# Altium schematic symbol library Diode - Rectifier.SchLib: 777 symbols (part 1 of 4) (continued)
## CGRC501-G (continued)
DIODE GEN PURP 50V 5A DO214AB; Manufacturer: Comchip Technology; Type: Standard; Current Reverse Leakage @ Vr: 10uA @ 50V; Voltage Forward (Vf): 1.15V @ 5A; Part Number: CGRC501-G; PartId: 27766; Supplier 1: Digi-Key; Supplier Part Number 1: 641-1174-1-ND; ComponentLink1Description: Datasheet; ComponentLink1URL: http://www.comchiptech.com/cms/UserFiles/CGRC501-G%20Thru.%20CGRC507-G%20RevA.pdf; ComponentLink2Description: Digi-Key Listing; ComponentLink2URL: https://www.digikey.com/product-detail/en/comchip-technology/CGRC501-G/641-1174-1-ND/1559135; Junction Operating Temperature: 150C (Max); Price: 0.46; Device Package: DO-214AB, SMC; Voltage DC Reverse (Vr): 50V; Current Rectified: 5A
footprint ST DO214AB SMC
pins: 1, 2

## CGRKM4001-HF
designator D?
DIODE GEN PURP 50V 1A SOD123F; Manufacturer: Comchip Technology; Type: Standard; Current Reverse Leakage @ Vr: 5uA @ 50V; Voltage Forward (Vf): 1.1V @ 1A; Part Number: CGRKM4001-HF; PartId: 29184; Supplier 1: Digi-Key; Supplier Part Number 1: 641-1511-1-ND; ComponentLink1Description: Datasheet; ComponentLink1URL: http://www.comchiptech.com/cms/UserFiles/CGRKM4001-HF%20Thru.%20CGRKM4007-HF%20RevG.pdf; ComponentLink2Description: Digi-Key Listing; ComponentLink2URL: https://www.digikey.com/product-detail/en/comchip-technology/CGRKM4001-HF/641-1511-1-ND/4772513; Junction Operating Temperature: -55C ~ 150C; Price: 0.36; Device Package: SOD-123F; Voltage DC Reverse (Vr): 50V; Current Rectified: 1A
footprint SOD123F
pins: 1, 2

## CGRKM4004-HF
designator D?
DIODE GEN PURP 400V 1A SOD123F; Manufacturer: Comchip Technology; Type: Standard; Voltage Forward (Vf): 1.1V @ 1A; Part Number: CGRKM4004-HF; PartId: 29227; Supplier 1: Digi-Key; Supplier Part Number 1: 641-1512-1-ND; ComponentLink1Description: Datasheet; ComponentLink1URL: http://www.comchiptech.com/cms/UserFiles/CGRKM4001-HF%20Thru.%20CGRKM4007-HF%20RevG.pdf; ComponentLink2Description: Digi-Key Listing; ComponentLink2URL: https://www.digikey.com/product-detail/en/comchip-technology/CGRKM4004-HF/641-1512-1-ND/4772516; Junction Operating Temperature: -55C ~ 150C; Price: 0.4; Device Package: SOD-123F; Voltage DC Reverse (Vr): 400V; Current Rectified: 1A
footprint SOD123F
pins: 1, 2

## CGRKM4005-HF
designator D?
DIODE GEN PURP 600V 1A SOD123F; Manufacturer: Comchip Technology; Type: Standard; Current Reverse Leakage @ Vr: 5uA @ 600V; Voltage Forward (Vf): 1V @ 1A; Part Number: CGRKM4005-HF; PartId: 29226; Supplier 1: Digi-Key; Supplier Part Number 1: 641-1513-1-ND; ComponentLink1Description: Datasheet; ComponentLink1URL: http://www.comchiptech.com/cms/UserFiles/CGRKM4001-HF%20Thru.%20CGRKM4007-HF%20RevG.pdf; ComponentLink2Description: Digi-Key Listing; ComponentLink2URL: https://www.digikey.com/product-detail/en/comchip-technology/CGRKM4005-HF/641-1513-1-ND/4772519; Junction Operating Temperature: -55C ~ 150C; Price: 0.36; Device Package: SOD-123F; Voltage DC Reverse (Vr): 600V; Current Rectified: 1A
footprint SOD123F
pins: 1, 2

## CGRKM4007-HF
designator D?
DIODE GEN PURP 1KV 1A SOD123F; Manufacturer: Comchip Technology; Type: Standard; Current Reverse Leakage @ Vr: 5uA @ 1000V; Voltage DC Reverse (Vr): 1000V (1kV); Voltage Forward (Vf): 1.1V @ 1A; Part Number: CGRKM4007-HF; PartId: 29183; Supplier 1: Digi-Key; Supplier Part Number 1: 641-1514-1-ND; ComponentLink1Description: Datasheet; ComponentLink1URL: http://www.comchiptech.com/cms/UserFiles/CGRKM4001-HF%20Thru.%20CGRKM4007-HF%20RevG.pdf; ComponentLink2Description: Digi-Key Listing; ComponentLink2URL: https://www.digikey.com/product-detail/en/comchip-technology/CGRKM4007-HF/641-1514-1-ND/4772522; Junction Operating Temperature: -55C ~ 150C; Price: 0.36; Device Package: SOD-123F; Current Rectified: 1A
footprint SOD123F
pins: 1, 2

## CMHD2003 TR
designator D?
DIODE GEN PURP 250V 200MA SOD123; Manufacturer: Central Semiconductor Corp; Type: Standard; Current Reverse Leakage @ Vr: 100nA @ 200V; Reverse Recovery Time (trr): 50ns; Voltage Forward (Vf): 1V @ 100mA; Part Number: CMHD2003 TR; PartId: 29414; Supplier 1: Digi-Key; Supplier Part Number 1: CMHD2003 CT-ND; ComponentLink1Description: Datasheet; ComponentLink1URL: https://www.centralsemi.com/get_document.php?cmp=1&mergetype=pd&mergepath=pd&pdf_id=CMHD2003.PDF; ComponentLink2Description: Digi-Key Listing; ComponentLink2URL: https://www.digikey.com/product-detail/en/central-semiconductor-corp/CMHD2003-TR/CMHD2003-CT-ND/5324446; Junction Operating Temperature: -65C ~ 150C; Price: 0.52; Device Package: SOD-123; Voltage DC Reverse (Vr): 250V; Current Rectified: 200mA
footprint SOD-123
pins: 1, 2

## CMHD3595 TR
designator D?
DIODE GEN PURP 150V 150MA SOD123; Manufacturer: Central Semiconductor Corp; Type: Standard; Current Reverse Leakage @ Vr: 1nA @ 125V; Reverse Recovery Time (trr): 3us; Voltage Forward (Vf): 1V @ 200mA; Part Number: CMHD3595 TR; PartId: 29438; Supplier 1: Digi-Key; Supplier Part Number 1: CMHD3595 CT-ND; ComponentLink1Description: Datasheet; ComponentLink1URL: https://www.centralsemi.com/get_document.php?cmp=1&mergetype=pd&mergepath=pd&pdf_id=CMHD3595.PDF; ComponentLink2Description: Digi-Key Listing; ComponentLink2URL: https://www.digikey.com/product-detail/en/central-semiconductor-corp/CMHD3595-TR/CMHD3595-CT-ND/4806988; Junction Operating Temperature: -65C ~ 150C; Price: 0.72; Device Package: SOD-123; Voltage DC Reverse (Vr): 150V; Current Rectified: 150mA
footprint SOD-123
pins: 1, 2

## CMHD4150 TR
designator D?
DIODE GEN PURP 50V 250MA SOD123; Manufacturer: Central Semiconductor Corp; Type: Standard; Current Reverse Leakage @ Vr: 100nA @ 50V; Reverse Recovery Time (trr): 4ns; Voltage Forward (Vf): 1V @ 200mA; Part Number: CMHD4150 TR; PartId: 29410; Supplier 1: Digi-Key; Supplier Part Number 1: CMHD4150 CT-ND; ComponentLink1Description: Datasheet; ComponentLink1URL: https://www.centralsemi.com/get_document.php?cmp=1&mergetype=pd&mergepath=pd&pdf_id=CMHD4150.PDF; ComponentLink2Description: Digi-Key Listing; ComponentLink2URL: https://www.digikey.com/product-detail/en/central-semiconductor-corp/CMHD4150-TR/CMHD4150-CT-ND/5324447; Junction Operating Temperature: -65C ~ 150C; Price: 0.45; Device Package: SOD-123; Voltage DC Reverse (Vr): 50V; Current Rectified: 250mA
footprint SOD-123
pins: 1, 2

## CMHD4448 TR
designator D?
DIODE GEN PURP 75V 250MA SOD123; Manufacturer: Central Semiconductor Corp; Type: Standard; Current Reverse Leakage @ Vr: 25nA @ 20V; Reverse Recovery Time (trr): 4ns; Voltage Forward (Vf): 1V @ 100mA; Part Number: CMHD4448 TR; PartId: 29433; Supplier 1: Digi-Key; Supplier Part Number 1: CMHD4448 CT-ND; ComponentLink1Description: Datasheet; ComponentLink1URL: https://www.centralsemi.com/get_document.php?cmp=1&mergetype=pd&mergepath=pd&pdf_id=CMHD4448.PDF; ComponentLink2Description: Digi-Key Listing; ComponentLink2URL: https://www.digikey.com/product-detail/en/central-semiconductor-corp/CMHD4448-TR/CMHD4448-CT-ND/5324448; Junction Operating Temperature: -65C ~ 150C; Price: 0.74; Device Package: SOD-123; Voltage DC Reverse (Vr): 75V; Current Rectified: 250mA
footprint SOD-123
pins: 1, 2

## CMHSH5-4 TR
designator D?
DIODE SCHOTTKY 40V 500MA SOD123; Manufacturer: Central Semiconductor Corp; Current Reverse Leakage @ Vr: 20uA @ 40V; Voltage Forward (Vf): 620mV @ 1A; Part Number: CMHSH5-4 TR; PartId: 29402; Supplier 1: Digi-Key; Supplier Part Number 1: CMHSH5-4 CT-ND; ComponentLink1Description: Datasheet; ComponentLink1URL: https://www.centralsemi.com/get_document.php?cmp=1&mergetype=pd&mergepath=pd&pdf_id=CMHSH5-4.PDF; ComponentLink2Description: Digi-Key Listing; ComponentLink2URL: https://www.digikey.com/product-detail/en/central-semiconductor-corp/CMHSH5-4-TR/CMHSH5-4-CT-ND/4806989; Junction Operating Temperature: -65C ~ 125C; Price: 0.46; Type: Schottky; Device Package: SOD-123; Voltage DC Reverse (Vr): 40V; Current Rectified: 500mA
footprint SOD-123
pins: 1, 2

## CMHSH-3 TR
designator D?
DIODE SCHOTTKY 30V 200MA SOD123; Manufacturer: Central Semiconductor Corp; Current Reverse Leakage @ Vr: 2uA @ 25V; Reverse Recovery Time (trr): 7ns; Voltage Forward (Vf): 1V @ 100mA; Part Number: CMHSH-3 TR; PartId: 29415; Supplier 1: Digi-Key; Supplier Part Number 1: CMHSH-3 CT-ND; ComponentLink1Description: Datasheet; ComponentLink1URL: https://www.centralsemi.com/get_document.php?cmp=1&mergetype=pd&mergepath=pd&pdf_id=CMHSH-3.PDF; ComponentLink2Description: Digi-Key Listing; ComponentLink2URL: https://www.digikey.com/product-detail/en/central-semiconductor-corp/CMHSH-3-TR/CMHSH-3-CT-ND/5324449; Junction Operating Temperature: -65C ~ 150C; Price: 0.52; Type: Schottky; Device Package: SOD-123; Voltage DC Reverse (Vr): 30V; Current Rectified: 200mA
footprint SOD-123
pins: 1, 2

## CMMR1-02 TR
designator D?
DIODE GEN PURP 200V 1A SOD123F; Manufacturer: Central Semiconductor Corp; Type: Standard; Current Reverse Leakage @ Vr: 10uA @ 200V; Voltage Forward (Vf): 1.1V @ 1A; Part Number: CMMR1-02 TR; PartId: 29320; Supplier 1: Digi-Key; Supplier Part Number 1: CMMR1-02 CT-ND; ComponentLink1Description: Datasheet; ComponentLink1URL: https://www.centralsemi.com/get_document.php?cmp=1&mergetype=pd&mergepath=pd&pdf_id=CMMR1_SERIES.PDF; ComponentLink2Description: Digi-Key Listing; ComponentLink2URL: https://www.digikey.com/product-detail/en/central-semiconductor-corp/CMMR1-02-TR/CMMR1-02-CT-ND/5324472; Junction Operating Temperature: -65C ~ 150C; Price: 1.01; Device Package: SOD-123F; Voltage DC Reverse (Vr): 200V; Current Rectified: 1A
footprint SOD123F
pins: 1, 2

## CMMR1-04 TR
designator D?
DIODE GEN PURP 400V 1A SOD123F; Manufacturer: Central Semiconductor Corp; Type: Standard; Current Reverse Leakage @ Vr: 10uA @ 400V; Voltage Forward (Vf): 1.1V @ 1A; Part Number: CMMR1-04 TR; PartId: 29250; Supplier 1: Digi-Key; Supplier Part Number 1: CMMR1-04 CT-ND; ComponentLink1Description: Datasheet; ComponentLink1URL: https://www.centralsemi.com/get_document.php?cmp=1&mergetype=pd&mergepath=pd&pdf_id=CMMR1_SERIES.PDF; ComponentLink2Description: Digi-Key Listing; ComponentLink2URL: https://www.digikey.com/product-detail/en/central-semiconductor-corp/CMMR1-04-TR/CMMR1-04-CT-ND/5324473; Junction Operating Temperature: -65C ~ 150C; Price: 0.51; Device Package: SOD-123F; Voltage DC Reverse (Vr): 400V; Current Rectified: 1A
footprint SOD123F
pins: 1, 2

## CMMR1-06 TR
designator D?
DIODE GEN PURP 600V 1A SOD123F; Manufacturer: Central Semiconductor Corp; Type: Standard; Current Reverse Leakage @ Vr: 10uA @ 600V; Voltage Forward (Vf): 1.1V @ 1A; Part Number: CMMR1-06 TR; PartId: 29237; Supplier 1: Digi-Key; Supplier Part Number 1: CMMR1-06 CT-ND; ComponentLink1Description: Datasheet; ComponentLink1URL: https://www.centralsemi.com/get_document.php?cmp=1&mergetype=pd&mergepath=pd&pdf_id=CMMR1_SERIES.PDF; ComponentLink2Description: Digi-Key Listing; ComponentLink2URL: https://www.digikey.com/product-detail/en/central-semiconductor-corp/CMMR1-06-TR/CMMR1-06-CT-ND/4807012; Junction Operating Temperature: -65C ~ 150C; Price: 0.62; Device Package: SOD-123F; Voltage DC Reverse (Vr): 600V; Current Rectified: 1A
footprint SOD123F
pins: 1, 2

## CMMR1-10 TR
designator D?
DIODE GEN PURP 1000V 1A SOD123F; Manufacturer: Central Semiconductor Corp; Type: Standard; Current Reverse Leakage @ Vr: 10uA @ 1000V; Voltage DC Reverse (Vr): 1000V (1kV); Voltage Forward (Vf): 1.1V @ 1A; Part Number: CMMR1-10 TR; PartId: 29316; Supplier 1: Digi-Key; Supplier Part Number 1: CMMR1-10 CT-ND; ComponentLink1Description: Datasheet; ComponentLink1URL: https://www.centralsemi.com/get_document.php?cmp=1&mergetype=pd&mergepath=pd&pdf_id=CMMR1_SERIES.PDF; ComponentLink2Description: Digi-Key Listing; ComponentLink2URL: https://www.digikey.com/product-detail/en/central-semiconductor-corp/CMMR1-10-TR/CMMR1-10-CT-ND/5211340; Junction Operating Temperature: -65C ~ 150C; Price: 0.65; Device Package: SOD-123F; Current Rectified: 1A
footprint SOD123F
pins: 1, 2

## CMMR1F-06 TR
designator D?
DIODE GEN PURP 600V 1A SOD123F; Manufacturer: Central Semiconductor Corp; Type: Standard; Current Reverse Leakage @ Vr: 1uA @ 600V; Reverse Recovery Time (trr): 250ns; Voltage Forward (Vf): 1.3V @ 1A; Part Number: CMMR1F-06 TR; PartId: 29318; Supplier 1: Digi-Key; Supplier Part Number 1: CMMR1F-06 CT-ND; ComponentLink1Description: Datasheet; ComponentLink1URL: https://www.centralsemi.com/get_document.php?cmp=1&mergetype=pd&mergepath=pd&pdf_id=CMMR1F-02_SERIES.PDF; ComponentLink2Description: Digi-Key Listing; ComponentLink2URL: https://www.digikey.com/product-detail/en/central-semiconductor-corp/CMMR1F-06-TR/CMMR1F-06-CT-ND/5324474; Junction Operating Temperature: -65C ~ 150C; Price: 0.92; Device Package: SOD-123F; Voltage DC Reverse (Vr): 600V; Current Rectified: 1A
footprint SOD123F
pins: 1, 2

## CMMR1S-02 TR
designator D?
DIODE GEN PURP 200V 1A SOD123F; Manufacturer: Central Semiconductor Corp; Type: Standard; Current Reverse Leakage @ Vr: 10uA @ 200V; Reverse Recovery Time (trr): 35ns; Voltage Forward (Vf): 950mV @ 1A; Part Number: CMMR1S-02 TR; PartId: 29236; Supplier 1: Digi-Key; Supplier Part Number 1: CMMR1S-02 CT-ND; ComponentLink1Description: Datasheet; ComponentLink1URL: https://www.centralsemi.com/get_document.php?cmp=1&mergetype=pd&mergepath=pd&pdf_id=CMMR1S-02.PDF; ComponentLink2Description: Digi-Key Listing; ComponentLink2URL: https://www.digikey.com/product-detail/en/central-semiconductor-corp/CMMR1S-02-TR/CMMR1S-02-CT-ND/4807013; Junction Operating Temperature: -65C ~ 150C; Price: 0.62; Device Package: SOD-123F; Voltage DC Reverse (Vr): 200V; Current Rectified: 1A
footprint SOD123F
pins: 1, 2

## CMMR1U-02 TR
designator D?
DIODE GEN PURP 200V 1A SOD123F; Manufacturer: Central Semiconductor Corp; Type: Standard; Current Reverse Leakage @ Vr: 1uA @ 200V; Reverse Recovery Time (trr): 50ns; Voltage Forward (Vf): 1.7V @ 1A; Part Number: CMMR1U-02 TR; PartId: 29178; Supplier 1: Digi-Key; Supplier Part Number 1: CMMR1U-02 CT-ND; ComponentLink1Description: Datasheet; ComponentLink1URL: https://www.centralsemi.com/get_document.php?cmp=1&mergetype=pd&mergepath=pd&pdf_id=CMMR1U_SERIES.PDF; ComponentLink2Description: Digi-Key Listing; ComponentLink2URL: https://www.digikey.com/product-detail/en/central-semiconductor-corp/CMMR1U-02-TR/CMMR1U-02-CT-ND/4807014; Junction Operating Temperature: -65C ~ 150C; Price: 0.83; Device Package: SOD-123F; Voltage DC Reverse (Vr): 200V; Current Rectified: 1A
footprint SOD123F
pins: 1, 2

## CMMR1U-04 TR
designator D?
DIODE GEN PURP 400V 1A SOD123F; Manufacturer: Central Semiconductor Corp; Type: Standard; Current Reverse Leakage @ Vr: 1uA @ 400V; Reverse Recovery Time (trr): 50ns; Voltage Forward (Vf): 1.4V @ 1A; Part Number: CMMR1U-04 TR; PartId: 29288; Supplier 1: Digi-Key; Supplier Part Number 1: CMMR1U-04 CT-ND; ComponentLink1Description: Datasheet; ComponentLink1URL: https://www.centralsemi.com/get_document.php?cmp=1&mergetype=pd&mergepath=pd&pdf_id=CMMR1U_SERIES.PDF; ComponentLink2Description: Digi-Key Listing; ComponentLink2URL: https://www.digikey.com/product-detail/en/central-semiconductor-corp/CMMR1U-04-TR/CMMR1U-04-CT-ND/5325384; Junction Operating Temperature: -65C ~ 150C; Price: 0.46; Device Package: SOD-123F; Voltage DC Reverse (Vr): 400V; Current Rectified: 1A
footprint SOD123F
pins: 1, 2

## CMMR1U-06 TR
designator D?
DIODE GEN PURP 600V 1A SOD123F; Manufacturer: Central Semiconductor Corp; Type: Standard; Current Reverse Leakage @ Vr: 1uA @ 600V; Reverse Recovery Time (trr): 100ns; Voltage Forward (Vf): 1.7V @ 1A; Part Number: CMMR1U-06 TR; PartId: 29224; Supplier 1: Digi-Key; Supplier Part Number 1: CMMR1U-06 CT-ND; ComponentLink1Description: Datasheet; ComponentLink1URL: https://www.centralsemi.com/get_document.php?cmp=1&mergetype=pd&mergepath=pd&pdf_id=CMMR1U_SERIES.PDF; ComponentLink2Description: Digi-Key Listing; ComponentLink2URL: https://www.digikey.com/product-detail/en/central-semiconductor-corp/CMMR1U-06-TR/CMMR1U-06-CT-ND/4807015; Junction Operating Temperature: -65C ~ 150C; Price: 0.76; Device Package: SOD-123F; Voltage DC Reverse (Vr): 600V; Current Rectified: 1A
footprint SOD123F
pins: 1, 2

## CMMR1U-08 TR
designator D?
DIODE GEN PURP 800V 1A SOD123F; Manufacturer: Central Semiconductor Corp; Type: Standard; Current Reverse Leakage @ Vr: 1uA @ 800V; Reverse Recovery Time (trr): 100ns; Voltage Forward (Vf): 1.7V @ 1A; Part Number: CMMR1U-08 TR; PartId: 29317; Supplier 1: Digi-Key; Supplier Part Number 1: CMMR1U-08 CT-ND; ComponentLink1Description: Datasheet; ComponentLink1URL: https://www.centralsemi.com/get_document.php?cmp=1&mergetype=pd&mergepath=pd&pdf_id=CMMR1U_SERIES.PDF; ComponentLink2Description: Digi-Key Listing; ComponentLink2URL: https://www.digikey.com/product-detail/en/central-semiconductor-corp/CMMR1U-08-TR/CMMR1U-08-CT-ND/5018686; Junction Operating Temperature: -65C ~ 150C; Price: 0.84; Device Package: SOD-123F; Voltage DC Reverse (Vr): 800V; Current Rectified: 1A
footprint SOD123F
pins: 1, 2

## CMMSH1-20G TR
designator D?
DIODE SCHOTTKY 20V 1A SOD123F; Manufacturer: Central Semiconductor Corp; Current Reverse Leakage @ Vr: 500uA @ 100V; Voltage Forward (Vf): 450mV @ 1A; Part Number: CMMSH1-20G TR; PartId: 29251; Supplier 1: Digi-Key; Supplier Part Number 1: CMMSH1-20G CT-ND; ComponentLink1Description: Datasheet; ComponentLink1URL: https://www.centralsemi.com/get_document.php?cmp=1&mergetype=pd&mergepath=pd&pdf_id=CMMSH1-40.PDF; ComponentLink2Description: Digi-Key Listing; ComponentLink2URL: https://www.digikey.com/product-detail/en/central-semiconductor-corp/CMMSH1-20G-TR/CMMSH1-20G-CT-ND/5324476; Price: 0.65; Type: Schottky; Device Package: SOD-123F; Voltage DC Reverse (Vr): 20V; Current Rectified: 1A
footprint SOD123F
pins: 1, 2

## CMMSH1-40G TR
designator D?
DIODE SCHOTTKY 40V 1A SOD123F; Manufacturer: Central Semiconductor Corp; Current Reverse Leakage @ Vr: 500uA @ 40V; Voltage Forward (Vf): 550mV @ 1A; Part Number: CMMSH1-40G TR; PartId: 29225; Supplier 1: Digi-Key; Supplier Part Number 1: CMMSH1-40G CT-ND; ComponentLink1Description: Datasheet; ComponentLink1URL: https://www.centralsemi.com/get_document.php?cmp=1&mergetype=pd&mergepath=pd&pdf_id=CMMSH1-40.PDF; ComponentLink2Description: Digi-Key Listing; ComponentLink2URL: https://www.digikey.com/product-detail/en/central-semiconductor-corp/CMMSH1-40G-TR/CMMSH1-40G-CT-ND/4807016; Junction Operating Temperature: -65C ~ 125C; Price: 0.99; Type: Schottky; Device Package: SOD-123F; Voltage DC Reverse (Vr): 40V; Current Rectified: 1A
footprint SOD123F
pins: 1, 2

## CMMSH1-100G TR
designator D?
DIODE SCHOTTKY 100V 1A SOD123F; Manufacturer: Central Semiconductor Corp; Current Reverse Leakage @ Vr: 500uA @ 100V; Voltage Forward (Vf): 850mV @ 1A; Part Number: CMMSH1-100G TR; PartId: 29321; Supplier 1: Digi-Key; Supplier Part Number 1: CMMSH1-100G CT-ND; ComponentLink1Description: Datasheet; ComponentLink1URL: https://www.centralsemi.com/get_document.php?cmp=1&mergetype=pd&mergepath=pd&pdf_id=CMMSH1-40.PDF; ComponentLink2Description: Digi-Key Listing; ComponentLink2URL: https://www.digikey.com/product-detail/en/central-semiconductor-corp/CMMSH1-100G-TR/CMMSH1-100G-CT-ND/5324475; Junction Operating Temperature: -65C ~ 125C; Price: 1.34; Type: Schottky; Device Package: SOD-123F; Voltage DC Reverse (Vr): 100V; Current Rectified: 1A
footprint SOD123F
pins: 1, 2

## CMR3-02 TR13
designator D?
DIODE GEN PURP 200V 3A SMC; Manufacturer: Central Semiconductor Corp; Type: Standard; Current Reverse Leakage @ Vr: 5uA @ 200V; Voltage Forward (Vf): 1.2V @ 3A; Part Number: CMR3-02 TR13; PartId: 27866; Supplier 1: Digi-Key; Supplier Part Number 1: CMR3-02 TR13CT-ND; ComponentLink1Description: Datasheet; ComponentLink1URL: https://www.centralsemi.com/get_document.php?cmp=1&mergetype=pd&mergepath=pd&pdf_id=CMR3-10.PDF; ComponentLink2Description: Digi-Key Listing; ComponentLink2URL: https://www.digikey.com/product-detail/en/central-semiconductor-corp/CMR3-02-TR13/CMR3-02-TR13CT-ND/5324529; Junction Operating Temperature: -65C ~ 175C; Price: 0.84; Device Package: DO-214AB, SMC; Voltage DC Reverse (Vr): 200V; Current Rectified: 3A
footprint ST DO214AB SMC
pins: 1, 2

## CMR3-04 TR13
designator D?
DIODE GEN PURP 400V 3A SMC; Manufacturer: Central Semiconductor Corp; Type: Standard; Current Reverse Leakage @ Vr: 5uA @ 400V; Voltage Forward (Vf): 1.2V @ 3A; Part Number: CMR3-04 TR13; PartId: 27867; Supplier 1: Digi-Key; Supplier Part Number 1: CMR3-04 TR13CT-ND; ComponentLink1Description: Datasheet; ComponentLink1URL: https://www.centralsemi.com/get_document.php?cmp=1&mergetype=pd&mergepath=pd&pdf_id=CMR3-10.PDF; ComponentLink2Description: Digi-Key Listing; ComponentLink2URL: https://www.digikey.com/product-detail/en/central-semiconductor-corp/CMR3-04-TR13/CMR3-04-TR13CT-ND/5324530; Junction Operating Temperature: -65C ~ 175C; Price: 0.84; Device Package: DO-214AB, SMC; Voltage DC Reverse (Vr): 400V; Current Rectified: 3A
footprint ST DO214AB SMC
pins: 1, 2

## CMR3-06 TR13
designator D?
DIODE GEN PURP 600V 3A SMC; Manufacturer: Central Semiconductor Corp; Type: Standard; Current Reverse Leakage @ Vr: 5uA @ 600V; Voltage Forward (Vf): 1.2V @ 3A; Part Number: CMR3-06 TR13; PartId: 27876; Supplier 1: Digi-Key; Supplier Part Number 1: CMR3-06 CT-ND; ComponentLink1Description: Datasheet; ComponentLink1URL: https://www.centralsemi.com/get_document.php?cmp=1&mergetype=pd&mergepath=pd&pdf_id=CMR3-10.PDF; ComponentLink2Description: Digi-Key Listing; ComponentLink2URL: https://www.digikey.com/product-detail/en/central-semiconductor-corp/CMR3-06-TR13/CMR3-06-CT-ND/4807103; Junction Operating Temperature: -65C ~ 175C; Price: 1.01; Device Package: DO-214AB, SMC; Voltage DC Reverse (Vr): 600V; Current Rectified: 3A
footprint ST DO214AB SMC
pins: 1, 2

## CMR3-10 TR13
designator D?
DIODE GEN PURP 1000V 3A SMC; Manufacturer: Central Semiconductor Corp; Type: Standard; Current Reverse Leakage @ Vr: 5uA @ 1000V; Voltage DC Reverse (Vr): 1000V (1kV); Voltage Forward (Vf): 1.2V @ 3A; Part Number: CMR3-10 TR13; PartId: 27800; Supplier 1: Digi-Key; Supplier Part Number 1: CMR3-10 TR13CT-ND; ComponentLink1Description: Datasheet; ComponentLink1URL: https://www.centralsemi.com/get_document.php?cmp=1&mergetype=pd&mergepath=pd&pdf_id=CMR3-10.PDF; ComponentLink2Description: Digi-Key Listing; ComponentLink2URL: https://www.digikey.com/product-detail/en/central-semiconductor-corp/CMR3-10-TR13/CMR3-10-TR13CT-ND/5324531; Junction Operating Temperature: -65C ~ 175C; Price: 1.28; Device Package: DO-214AB, SMC; Current Rectified: 3A
footprint ST DO214AB SMC
pins: 1, 2

## CMR3U-01 TR13
designator D?
DIODE GEN PURP 100V 3A SMC; Manufacturer: Central Semiconductor Corp; Type: Standard; Current Reverse Leakage @ Vr: 5uA @ 100V; Reverse Recovery Time (trr): 50ns; Voltage Forward (Vf): 1V @ 3A; Part Number: CMR3U-01 TR13; PartId: 27880; Supplier 1: Digi-Key; Supplier Part Number 1: CMR3U-01 TR13CT-ND; ComponentLink1Description: Datasheet; ComponentLink1URL: https://www.centralsemi.com/get_document.php?cmp=1&mergetype=pd&mergepath=pd&pdf_id=CMR3U-01.PDF; ComponentLink2Description: Digi-Key Listing; ComponentLink2URL: https://www.digikey.com/product-detail/en/central-semiconductor-corp/CMR3U-01-TR13/CMR3U-01-TR13CT-ND/5324532; Junction Operating Temperature: -65C ~ 175C; Price: 1.11; Device Package: DO-214AB, SMC; Voltage DC Reverse (Vr): 100V; Current Rectified: 3A
footprint ST DO214AB SMC
pins: 1, 2

## CMR3U-02 TR13
designator D?
DIODE GEN PURP 200V 3A SMC; Manufacturer: Central Semiconductor Corp; Type: Standard; Current Reverse Leakage @ Vr: 5uA @ 200V; Reverse Recovery Time (trr): 50ns; Voltage Forward (Vf): 1V @ 3A; Part Number: CMR3U-02 TR13; PartId: 27886; Supplier 1: Digi-Key; Supplier Part Number 1: CMR3U-02 TR13CT-ND; ComponentLink1Description: Datasheet; ComponentLink1URL: https://www.centralsemi.com/get_document.php?cmp=1&mergetype=pd&mergepath=pd&pdf_id=CMR3U-01.PDF; ComponentLink2Description: Digi-Key Listing; ComponentLink2URL: https://www.digikey.com/product-detail/en/central-semiconductor-corp/CMR3U-02-TR13/CMR3U-02-TR13CT-ND/5324533; Junction Operating Temperature: -65C ~ 175C; Price: 1.69; Device Package: DO-214AB, SMC; Voltage DC Reverse (Vr): 200V; Current Rectified: 3A
footprint ST DO214AB SMC
pins: 1, 2

## CMR3U-02M TR13
designator D?
DIODE GEN PURP 200V 3A SMC; Manufacturer: Central Semiconductor Corp; Type: Standard; Current Reverse Leakage @ Vr: 5uA @ 200V; Reverse Recovery Time (trr): 50ns; Voltage Forward (Vf): 1V @ 3A; Part Number: CMR3U-02M TR13; PartId: 27889; Supplier 1: Digi-Key; Supplier Part Number 1: CMR3U-02M TR13CT-ND; ComponentLink1Description: Datasheet; ComponentLink1URL: https://www.centralsemi.com/get_document.php?cmp=1&mergetype=pd&mergepath=pd&pdf_id=CMR3U-01M-10M.PDF; ComponentLink2Description: Digi-Key Listing; ComponentLink2URL: https://www.digikey.com/product-detail/en/central-semiconductor-corp/CMR3U-02M-TR13/CMR3U-02M-TR13CT-ND/5324534; Junction Operating Temperature: -65C ~ 175C; Price: 2.2; Device Package: DO-214AB, SMC; Voltage DC Reverse (Vr): 200V; Current Rectified: 3A
footprint ST DO214AB SMC
pins: 1, 2

## CMR3U-04 TR13
designator D?
DIODE GEN PURP 400V 3A SMC; Manufacturer: Central Semiconductor Corp; Type: Standard; Current Reverse Leakage @ Vr: 5uA @ 400V; Reverse Recovery Time (trr): 50ns; Voltage Forward (Vf): 1.25V @ 3A; Part Number: CMR3U-04 TR13; PartId: 27882; Supplier 1: Digi-Key; Supplier Part Number 1: CMR3U-04 CT-ND; ComponentLink1Description: Datasheet; ComponentLink1URL: https://www.centralsemi.com/get_document.php?cmp=1&mergetype=pd&mergepath=pd&pdf_id=CMR3U-01.PDF; ComponentLink2Description: Digi-Key Listing; ComponentLink2URL: https://www.digikey.com/product-detail/en/central-semiconductor-corp/CMR3U-04-TR13/CMR3U-04-CT-ND/4807104; Junction Operating Temperature: -65C ~ 175C; Price: 1.56; Device Package: DO-214AB, SMC; Voltage DC Reverse (Vr): 400V; Current Rectified: 3A
footprint ST DO214AB SMC
pins: 1, 2

## CMR3U-04M TR13
designator D?
DIODE GEN PURP 400V 3A SMC; Manufacturer: Central Semiconductor Corp; Type: Standard; Current Reverse Leakage @ Vr: 5uA @ 400V; Reverse Recovery Time (trr): 50ns; Voltage Forward (Vf): 1.25V @ 3A; Part Number: CMR3U-04M TR13; PartId: 27872; Supplier 1: Digi-Key; Supplier Part Number 1: CMR3U-04M TR13CT-ND; ComponentLink1Description: Datasheet; ComponentLink1URL: https://www.centralsemi.com/get_document.php?cmp=1&mergetype=pd&mergepath=pd&pdf_id=CMR3U-01M-10M.PDF; ComponentLink2Description: Digi-Key Listing; ComponentLink2URL: https://www.digikey.com/product-detail/en/central-semiconductor-corp/CMR3U-04M-TR13/CMR3U-04M-TR13CT-ND/5324535; Junction Operating Temperature: -65C ~ 175C; Price: 0.92; Device Package: DO-214AB, SMC; Voltage DC Reverse (Vr): 400V; Current Rectified: 3A
footprint ST DO214AB SMC
pins: 1, 2

## CMR3U-06M TR13
designator D?
DIODE GEN PURP 600V 3A SMC; Manufacturer: Central Semiconductor Corp; Type: Standard; Current Reverse Leakage @ Vr: 5uA @ 600V; Reverse Recovery Time (trr): 100ns; Voltage Forward (Vf): 1.4V @ 3A; Part Number: CMR3U-06M TR13; PartId: 27875; Supplier 1: Digi-Key; Supplier Part Number 1: CMR3U-06M TR13CT-ND; ComponentLink1Description: Datasheet; ComponentLink1URL: https://www.centralsemi.com/get_document.php?cmp=1&mergetype=pd&mergepath=pd&pdf_id=CMR3U-01M-10M.PDF; ComponentLink2Description: Digi-Key Listing; ComponentLink2URL: https://www.digikey.com/product-detail/en/central-semiconductor-corp/CMR3U-06M-TR13/CMR3U-06M-TR13CT-ND/5324536; Junction Operating Temperature: -65C ~ 175C; Price: 0.96; Device Package: DO-214AB, SMC; Voltage DC Reverse (Vr): 600V; Current Rectified: 3A
footprint ST DO214AB SMC
pins: 1, 2

## CMR3U-10 TR13
designator D?
DIODE GEN PURP 1000V 3A SMC; Manufacturer: Central Semiconductor Corp; Type: Standard; Current Reverse Leakage @ Vr: 5uA @ 1000V; Reverse Recovery Time (trr): 100ns; Voltage DC Reverse (Vr): 1000V (1kV); Voltage Forward (Vf): 1.7V @ 3A; Part Number: CMR3U-10 TR13; PartId: 27884; Supplier 1: Digi-Key; Supplier Part Number 1: CMR3U-10 TR13CT-ND; ComponentLink1Description: Datasheet; ComponentLink1URL: https://www.centralsemi.com/get_document.php?cmp=1&mergetype=pd&mergepath=pd&pdf_id=CMR3U-01.PDF; ComponentLink2Description: Digi-Key Listing; ComponentLink2URL: https://www.digikey.com/product-detail/en/central-semiconductor-corp/CMR3U-10-TR13/CMR3U-10-TR13CT-ND/5324537; Junction Operating Temperature: -65C ~ 175C; Price: 1.61; Device Package: DO-214AB, SMC; Current Rectified: 3A
footprint ST DO214AB SMC
pins: 1, 2

## CMR3U-10M TR13
designator D?
DIODE GEN PURP 1000V 3A SMC; Manufacturer: Central Semiconductor Corp; Type: Standard; Current Reverse Leakage @ Vr: 5uA @ 1000V; Reverse Recovery Time (trr): 100ns; Voltage DC Reverse (Vr): 1000V (1kV); Voltage Forward (Vf): 2V @ 3A; Part Number: CMR3U-10M TR13; PartId: 27888; Supplier 1: Digi-Key; Supplier Part Number 1: CMR3U-10M TR13CT-ND; ComponentLink1Description: Datasheet; ComponentLink1URL: https://www.centralsemi.com/get_document.php?cmp=1&mergetype=pd&mergepath=pd&pdf_id=CMR3U-01M-10M.PDF; ComponentLink2Description: Digi-Key Listing; ComponentLink2URL: https://www.digikey.com/product-detail/en/central-semiconductor-corp/CMR3U-10M-TR13/CMR3U-10M-TR13CT-ND/5324538; Junction Operating Temperature: -65C ~ 175C; Price: 1.93; Device Package: DO-214AB, SMC; Current Rectified: 3A
footprint ST DO214AB SMC
pins: 1, 2

## CMR5H-06 TR13
designator D?
DIODE HYPERFAST 600V 5A SMC; Manufacturer: Central Semiconductor Corp; Type: Standard; Current Reverse Leakage @ Vr: 1uA @ 600V; Reverse Recovery Time (trr): 22ns; Voltage Forward (Vf): 1.7V @ 5A; Part Number: CMR5H-06 TR13; PartId: 27877; Supplier 1: Digi-Key; Supplier Part Number 1: CMR5H-06 CT-ND; ComponentLink1Description: Datasheet; ComponentLink1URL: https://www.centralsemi.com/get_document.php?cmp=1&mergetype=pd&mergepath=pd&pdf_id=CMR5H-06.PDF; ComponentLink2Description: Digi-Key Listing; ComponentLink2URL: https://www.digikey.com/product-detail/en/central-semiconductor-corp/CMR5H-06-TR13/CMR5H-06-CT-ND/5018687; Junction Operating Temperature: -65C ~ 175C; Price: 1.03; Device Package: DO-214AB, SMC; Voltage DC Reverse (Vr): 600V; Current Rectified: 5A
footprint ST DO214AB SMC
pins: 1, 2

## CMR5U-02 TR13
designator D?
DIODE GEN PURP 600V 5A SMC; Manufacturer: Central Semiconductor Corp; Type: Standard; Current Reverse Leakage @ Vr: 1uA @ 600V; Reverse Recovery Time (trr): 22ns; Voltage Forward (Vf): 1.7V @ 5A; Part Number: CMR5U-02 TR13; PartId: 27881; Supplier 1: Digi-Key; Supplier Part Number 1: CMR5U-02 CT-ND; ComponentLink1Description: Datasheet; ComponentLink1URL: https://www.centralsemi.com/get_document.php?cmp=1&mergetype=pd&mergepath=pd&pdf_id=CMR5U-02-08.PDF; ComponentLink2Description: Digi-Key Listing; ComponentLink2URL: https://www.digikey.com/product-detail/en/central-semiconductor-corp/CMR5U-02-TR13/CMR5U-02-CT-ND/5018688; Junction Operating Temperature: -65C ~ 175C; Price: 1.15; Device Package: DO-214AB, SMC; Voltage DC Reverse (Vr): 600V; Current Rectified: 5A
footprint ST DO214AB SMC
pins: 1, 2

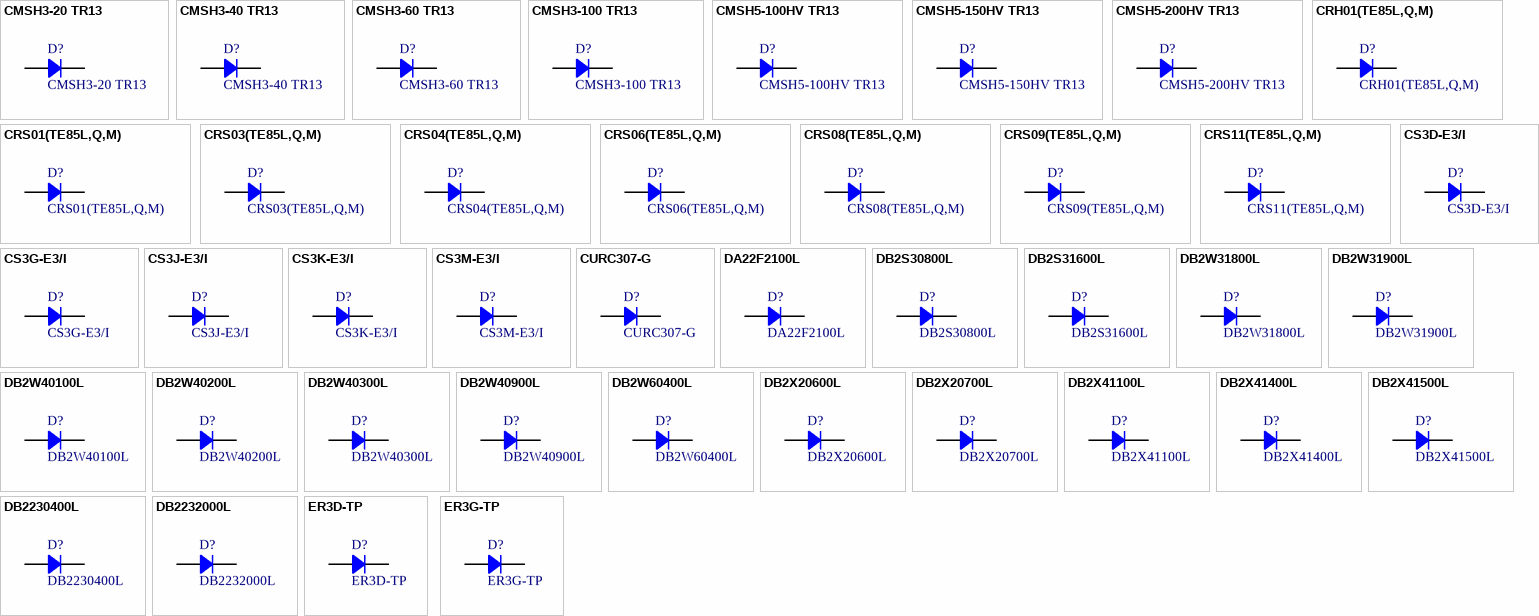
[diagram p5: symbols CMSH3-20 TR13 to ER3G-TP]

## CMSH3-20 TR13
designator D?
DIODE SCHOTTKY 20V 3A SMC; Manufacturer: Central Semiconductor Corp; Current Reverse Leakage @ Vr: 500uA @ 20V; Voltage Forward (Vf): 500mV @ 3A; Part Number: CMSH3-20 TR13; PartId: 27857; Supplier 1: Digi-Key; Supplier Part Number 1: CMSH3-20 TR13CT-ND; ComponentLink1Description: Datasheet; ComponentLink1URL: https://www.centralsemi.com/get_document.php?cmp=1&mergetype=pd&mergepath=pd&pdf_id=CMSH3-20.PDF; ComponentLink2Description: Digi-Key Listing; ComponentLink2URL: https://www.digikey.com/product-detail/en/central-semiconductor-corp/CMSH3-20-TR13/CMSH3-20-TR13CT-ND/5324550; Junction Operating Temperature: -65C ~ 150C; Price: 0.68; Type: Schottky; Device Package: DO-214AB, SMC; Voltage DC Reverse (Vr): 20V; Current Rectified: 3A
footprint ST DO214AB SMC
pins: 1, 2

## CMSH3-40 TR13
designator D?
DIODE SCHOTTKY 40V 3A SMC; Manufacturer: Central Semiconductor Corp; Current Reverse Leakage @ Vr: 500uA @ 40V; Voltage Forward (Vf): 500mV @ 3A; Part Number: CMSH3-40 TR13; PartId: 27790; Supplier 1: Digi-Key; Supplier Part Number 1: CMSH3-40 CT-ND; ComponentLink1Description: Datasheet; ComponentLink1URL: https://www.centralsemi.com/get_document.php?cmp=1&mergetype=pd&mergepath=pd&pdf_id=CMSH3-20.PDF; ComponentLink2Description: Digi-Key Listing; ComponentLink2URL: https://www.digikey.com/product-detail/en/central-semiconductor-corp/CMSH3-40-TR13/CMSH3-40-CT-ND/4807120; Junction Operating Temperature: -65C ~ 150C; Price: 1.02; Type: Schottky; Device Package: DO-214AB, SMC; Voltage DC Reverse (Vr): 40V; Current Rectified: 3A
footprint ST DO214AB SMC
pins: 1, 2

## CMSH3-60 TR13
designator D?
DIODE SCHOTTKY 60V 3A SMC; Manufacturer: Central Semiconductor Corp; Current Reverse Leakage @ Vr: 500uA @ 60V; Voltage Forward (Vf): 700mV @ 3A; Part Number: CMSH3-60 TR13; PartId: 27878; Supplier 1: Digi-Key; Supplier Part Number 1: CMSH3-60 TR13CT-ND; ComponentLink1Description: Datasheet; ComponentLink1URL: https://www.centralsemi.com/get_document.php?cmp=1&mergetype=pd&mergepath=pd&pdf_id=CMSH3-20.PDF; ComponentLink2Description: Digi-Key Listing; ComponentLink2URL: https://www.digikey.com/product-detail/en/central-semiconductor-corp/CMSH3-60-TR13/CMSH3-60-TR13CT-ND/5324553; Junction Operating Temperature: -65C ~ 150C; Price: 1.07; Type: Schottky; Device Package: DO-214AB, SMC; Voltage DC Reverse (Vr): 60V; Current Rectified: 3A
footprint ST DO214AB SMC
pins: 1, 2

## CMSH3-100 TR13
designator D?
DIODE SCHOTTKY 100V 3A SMC; Manufacturer: Central Semiconductor Corp; Current Reverse Leakage @ Vr: 500uA @ 100V; Voltage Forward (Vf): 800mV @ 2A; Part Number: CMSH3-100 TR13; PartId: 27799; Supplier 1: Digi-Key; Supplier Part Number 1: CMSH3-100 TR13CT-ND; ComponentLink1Description: Datasheet; ComponentLink1URL: https://www.centralsemi.com/get_document.php?cmp=1&mergetype=pd&mergepath=pd&pdf_id=CMSH3-20.PDF; ComponentLink2Description: Digi-Key Listing; ComponentLink2URL: https://www.digikey.com/product-detail/en/central-semiconductor-corp/CMSH3-100-TR13/CMSH3-100-TR13CT-ND/5324548; Junction Operating Temperature: -65C ~ 150C; Price: 1.2; Type: Schottky; Device Package: DO-214AB, SMC; Voltage DC Reverse (Vr): 100V; Current Rectified: 3A
footprint ST DO214AB SMC
pins: 1, 2

## CMSH5-100HV TR13
designator D?
DIODE SCHOTTKY 100V 5A SMC; Manufacturer: Central Semiconductor Corp; Current Reverse Leakage @ Vr: 50uA @ 100V; Voltage Forward (Vf): 800mV @ 5A; Part Number: CMSH5-100HV TR13; PartId: 27761; Supplier 1: Digi-Key; Supplier Part Number 1: CMSH5-100HV CT-ND; ComponentLink1Description: Datasheet; ComponentLink1URL: https://www.centralsemi.com/get_document.php?cmp=1&mergetype=pd&mergepath=pd&pdf_id=CMSH5-100HV_SERIES.PDF; ComponentLink2Description: Digi-Key Listing; ComponentLink2URL: https://www.digikey.com/product-detail/en/central-semiconductor-corp/CMSH5-100HV-TR13/CMSH5-100HV-CT-ND/4807122; Junction Operating Temperature: -65C ~ 175C; Price: 1.1; Type: Schottky; Device Package: DO-214AB, SMC; Voltage DC Reverse (Vr): 100V; Current Rectified: 5A
footprint ST DO214AB SMC
pins: 1, 2

## CMSH5-150HV TR13
designator D?
DIODE SCHOTTKY 150V 5A SMC; Manufacturer: Central Semiconductor Corp; Current Reverse Leakage @ Vr: 50uA @ 150V; Voltage Forward (Vf): 800mV @ 5A; Part Number: CMSH5-150HV TR13; PartId: 27762; Supplier 1: Digi-Key; Supplier Part Number 1: CMSH5-150HV CT-ND; ComponentLink1Description: Datasheet; ComponentLink1URL: https://www.centralsemi.com/get_document.php?cmp=1&mergetype=pd&mergepath=pd&pdf_id=CMSH5-100HV_SERIES.PDF; ComponentLink2Description: Digi-Key Listing; ComponentLink2URL: https://www.digikey.com/product-detail/en/central-semiconductor-corp/CMSH5-150HV-TR13/CMSH5-150HV-CT-ND/4807123; Junction Operating Temperature: -60C ~ 175C; Price: 1.23; Type: Schottky; Device Package: DO-214AB, SMC; Voltage DC Reverse (Vr): 150V; Current Rectified: 5A
footprint ST DO214AB SMC
pins: 1, 2

## CMSH5-200HV TR13
designator D?
DIODE SCHOTTKY 200V 5A SMC; Manufacturer: Central Semiconductor Corp; Current Reverse Leakage @ Vr: 50uA @ 200V; Voltage Forward (Vf): 900mV @ 5A; Part Number: CMSH5-200HV TR13; PartId: 27791; Supplier 1: Digi-Key; Supplier Part Number 1: CMSH5-200HV CT-ND; ComponentLink1Description: Datasheet; ComponentLink1URL: https://www.centralsemi.com/get_document.php?cmp=1&mergetype=pd&mergepath=pd&pdf_id=CMSH5-100HV_SERIES.PDF; ComponentLink2Description: Digi-Key Listing; ComponentLink2URL: https://www.digikey.com/product-detail/en/central-semiconductor-corp/CMSH5-200HV-TR13/CMSH5-200HV-CT-ND/4807124; Junction Operating Temperature: -60C ~ 175C; Price: 1.37; Type: Schottky; Device Package: DO-214AB, SMC; Voltage DC Reverse (Vr): 200V; Current Rectified: 5A
footprint ST DO214AB SMC
pins: 1, 2

## CRH01(TE85L,Q,M)
designator D?
DIODE GEN PURP 200V 1A SFLAT; Manufacturer: Toshiba Semiconductor and Storage; Type: Standard; Current Reverse Leakage @ Vr: 10uA @ 200V; Reverse Recovery Time (trr): 35ns; Voltage Forward (Vf): 980mV @ 1A; Part Number: CRH01(TE85L,Q,M); PartId: 29177; Supplier 1: Digi-Key; Supplier Part Number 1: CRH01QCT-ND; ComponentLink1Description: Datasheet; ComponentLink1URL: http://toshiba.semicon-storage.com/info/docget.jsp?did=3154&prodName=CRH01; ComponentLink2Description: Digi-Key Listing; ComponentLink2URL: https://www.digikey.com/product-detail/en/toshiba-semiconductor-and-storage/CRH01(TE85L,Q,M)/CRH01QCT-ND/871548; Junction Operating Temperature: -40C ~ 150C; Price: 0.58; Device Package: SOD-123F; Voltage DC Reverse (Vr): 200V; Current Rectified: 1A
footprint SOD123F
pins: 1, 2

## CRS01(TE85L,Q,M)
designator D?
DIODE SCHOTTKY 30V 1A SFLAT; Manufacturer: Toshiba Semiconductor and Storage; Current Reverse Leakage @ Vr: 1.5mA @ 30V; Voltage Forward (Vf): 360mV @ 1A; Part Number: CRS01(TE85L,Q,M); PartId: 29170; Supplier 1: Digi-Key; Supplier Part Number 1: CRS01QCT-ND; ComponentLink1Description: Datasheet; ComponentLink1URL: http://toshiba.semicon-storage.com/info/docget.jsp?did=3157&prodName=CRS01; ComponentLink2Description: Digi-Key Listing; ComponentLink2URL: https://www.digikey.com/product-detail/en/toshiba-semiconductor-and-storage/CRS01(TE85L,Q,M)/CRS01QCT-ND/871551; Junction Operating Temperature: -40C ~ 125C; Price: 0.44; Type: Schottky; Device Package: SOD-123F; Voltage DC Reverse (Vr): 30V; Current Rectified: 1A
footprint SOD123F
pins: 1, 2

## CRS03(TE85L,Q,M)
designator D?
DIODE SCHOTTKY 30V 1A SFLAT; Manufacturer: Toshiba Semiconductor and Storage; Current Reverse Leakage @ Vr: 100uA @ 30V; Voltage Forward (Vf): 450mV @ 1A; Part Number: CRS03(TE85L,Q,M); PartId: 29214; Supplier 1: Digi-Key; Supplier Part Number 1: CRS03QCT-ND; ComponentLink1Description: Datasheet; ComponentLink1URL: http://toshiba.semicon-storage.com/info/docget.jsp?did=3159&prodName=CRS03; ComponentLink2Description: Digi-Key Listing; ComponentLink2URL: https://www.digikey.com/product-detail/en/toshiba-semiconductor-and-storage/CRS03(TE85L,Q,M)/CRS03QCT-ND/871555; Junction Operating Temperature: -40C ~ 150C; Price: 0.44; Type: Schottky; Device Package: SOD-123F; Voltage DC Reverse (Vr): 30V; Current Rectified: 1A
footprint SOD123F
pins: 1, 2

## CRS04(TE85L,Q,M)
designator D?
DIODE SCHOTTKY 40V 1A SFLAT; Manufacturer: Toshiba Semiconductor and Storage; Current Reverse Leakage @ Vr: 100uA @ 40V; Voltage Forward (Vf): 510mV @ 1A; Part Number: CRS04(TE85L,Q,M); PartId: 29174; Supplier 1: Digi-Key; Supplier Part Number 1: CRS04QCT-ND; ComponentLink1Description: Datasheet; ComponentLink1URL: https://toshiba.semicon-storage.com/info/docget.jsp?did=3161&prodName=CRS04; ComponentLink2Description: Digi-Key Listing; ComponentLink2URL: https://www.digikey.com/product-detail/en/toshiba-semiconductor-and-storage/CRS04(TE85L,Q,M)/CRS04QCT-ND/871556; Junction Operating Temperature: -40C ~ 150C; Price: 0.52; Type: Schottky; Device Package: SOD-123F; Voltage DC Reverse (Vr): 40V; Current Rectified: 1A
footprint SOD123F
pins: 1, 2

## CRS06(TE85L,Q,M)
designator D?
DIODE SCHOTTKY 20V 1A SFLAT; Manufacturer: Toshiba Semiconductor and Storage; Current Reverse Leakage @ Vr: 1mA @ 20V; Voltage Forward (Vf): 360mV @ 1A; Part Number: CRS06(TE85L,Q,M); PartId: 29220; Supplier 1: Digi-Key; Supplier Part Number 1: CRS06QMCT-ND; ComponentLink1Description: Datasheet; ComponentLink1URL: http://toshiba.semicon-storage.com/info/docget.jsp?did=3165&prodName=CRS06; ComponentLink2Description: Digi-Key Listing; ComponentLink2URL: https://www.digikey.com/product-detail/en/toshiba-semiconductor-and-storage/CRS06(TE85L,Q,M)/CRS06QMCT-ND/871561; Junction Operating Temperature: -40C ~ 125C; Price: 0.52; Type: Schottky; Device Package: SOD-123F; Voltage DC Reverse (Vr): 20V; Current Rectified: 1A
footprint SOD123F
pins: 1, 2

## CRS08(TE85L,Q,M)
designator D?
DIODE SCHOTTKY 30V 1.5A SFLAT; Manufacturer: Toshiba Semiconductor and Storage; Current Reverse Leakage @ Vr: 1mA @ 30V; Voltage Forward (Vf): 360mV @ 1.5A; Part Number: CRS08(TE85L,Q,M); PartId: 29176; Supplier 1: Digi-Key; Supplier Part Number 1: CRS08QMCT-ND; ComponentLink1Description: Datasheet; ComponentLink1URL: http://toshiba.semicon-storage.com/info/docget.jsp?did=3168&prodName=CRS08; ComponentLink2Description: Digi-Key Listing; ComponentLink2URL: https://www.digikey.com/product-detail/en/toshiba-semiconductor-and-storage/CRS08(TE85L,Q,M)/CRS08QMCT-ND/871562; Junction Operating Temperature: -40C ~ 125C; Price: 0.58; Type: Schottky; Device Package: SOD-123F; Voltage DC Reverse (Vr): 30V; Current Rectified: 1.5A
footprint SOD123F
pins: 1, 2

## CRS09(TE85L,Q,M)
designator D?
DIODE SCHOTTKY 30V 1.5A SFLAT; Manufacturer: Toshiba Semiconductor and Storage; Current Reverse Leakage @ Vr: 50uA @ 30V; Voltage Forward (Vf): 460mV @ 1.5A; Part Number: CRS09(TE85L,Q,M); PartId: 29223; Supplier 1: Digi-Key; Supplier Part Number 1: CRS09QCT-ND; ComponentLink1Description: Datasheet; ComponentLink1URL: http://toshiba.semicon-storage.com/info/docget.jsp?did=3170&prodName=CRS09; ComponentLink2Description: Digi-Key Listing; ComponentLink2URL: https://www.digikey.com/product-detail/en/toshiba-semiconductor-and-storage/CRS09(TE85L,Q,M)/CRS09QCT-ND/871564; Junction Operating Temperature: -40C ~ 150C; Price: 0.56; Type: Schottky; Device Package: SOD-123F; Voltage DC Reverse (Vr): 30V; Current Rectified: 1.5A
footprint SOD123F
pins: 1, 2

## CRS11(TE85L,Q,M)
designator D?
DIODE SCHOTTKY 30V 1A SFLAT; Manufacturer: Toshiba Semiconductor and Storage; Current Reverse Leakage @ Vr: 1.5mA @ 30V; Voltage Forward (Vf): 360mV @ 1A; Part Number: CRS11(TE85L,Q,M); PartId: 29235; Supplier 1: Digi-Key; Supplier Part Number 1: CRS11(TE85LQM)CT-ND; ComponentLink1Description: Datasheet; ComponentLink1URL: http://toshiba.semicon-storage.com/info/docget.jsp?did=3172&prodName=CRS11; ComponentLink2Description: Digi-Key Listing; ComponentLink2URL: https://www.digikey.com/product-detail/en/toshiba-semiconductor-and-storage/CRS11(TE85L,Q,M)/CRS11(TE85LQM)CT-ND/871566; Junction Operating Temperature: -40C ~ 125C; Price: 0.54; Type: Schottky; Device Package: SOD-123F; Voltage DC Reverse (Vr): 30V; Current Rectified: 1A
footprint SOD123F
pins: 1, 2